# Altium footprint library ref-packages-longpad.PCBLIB: 1527 footprints (part 30 of 103)
Each footprint in its own frame and in the unit in brackets; x right, y up, seen from the top. Pads: shape width x height; smd on the part's side, far side on the other; paste and mask are expansions set on the pad; w line width, h text height; cw(c..) or ccw(c..) is an arc to the next point about the centre after c.
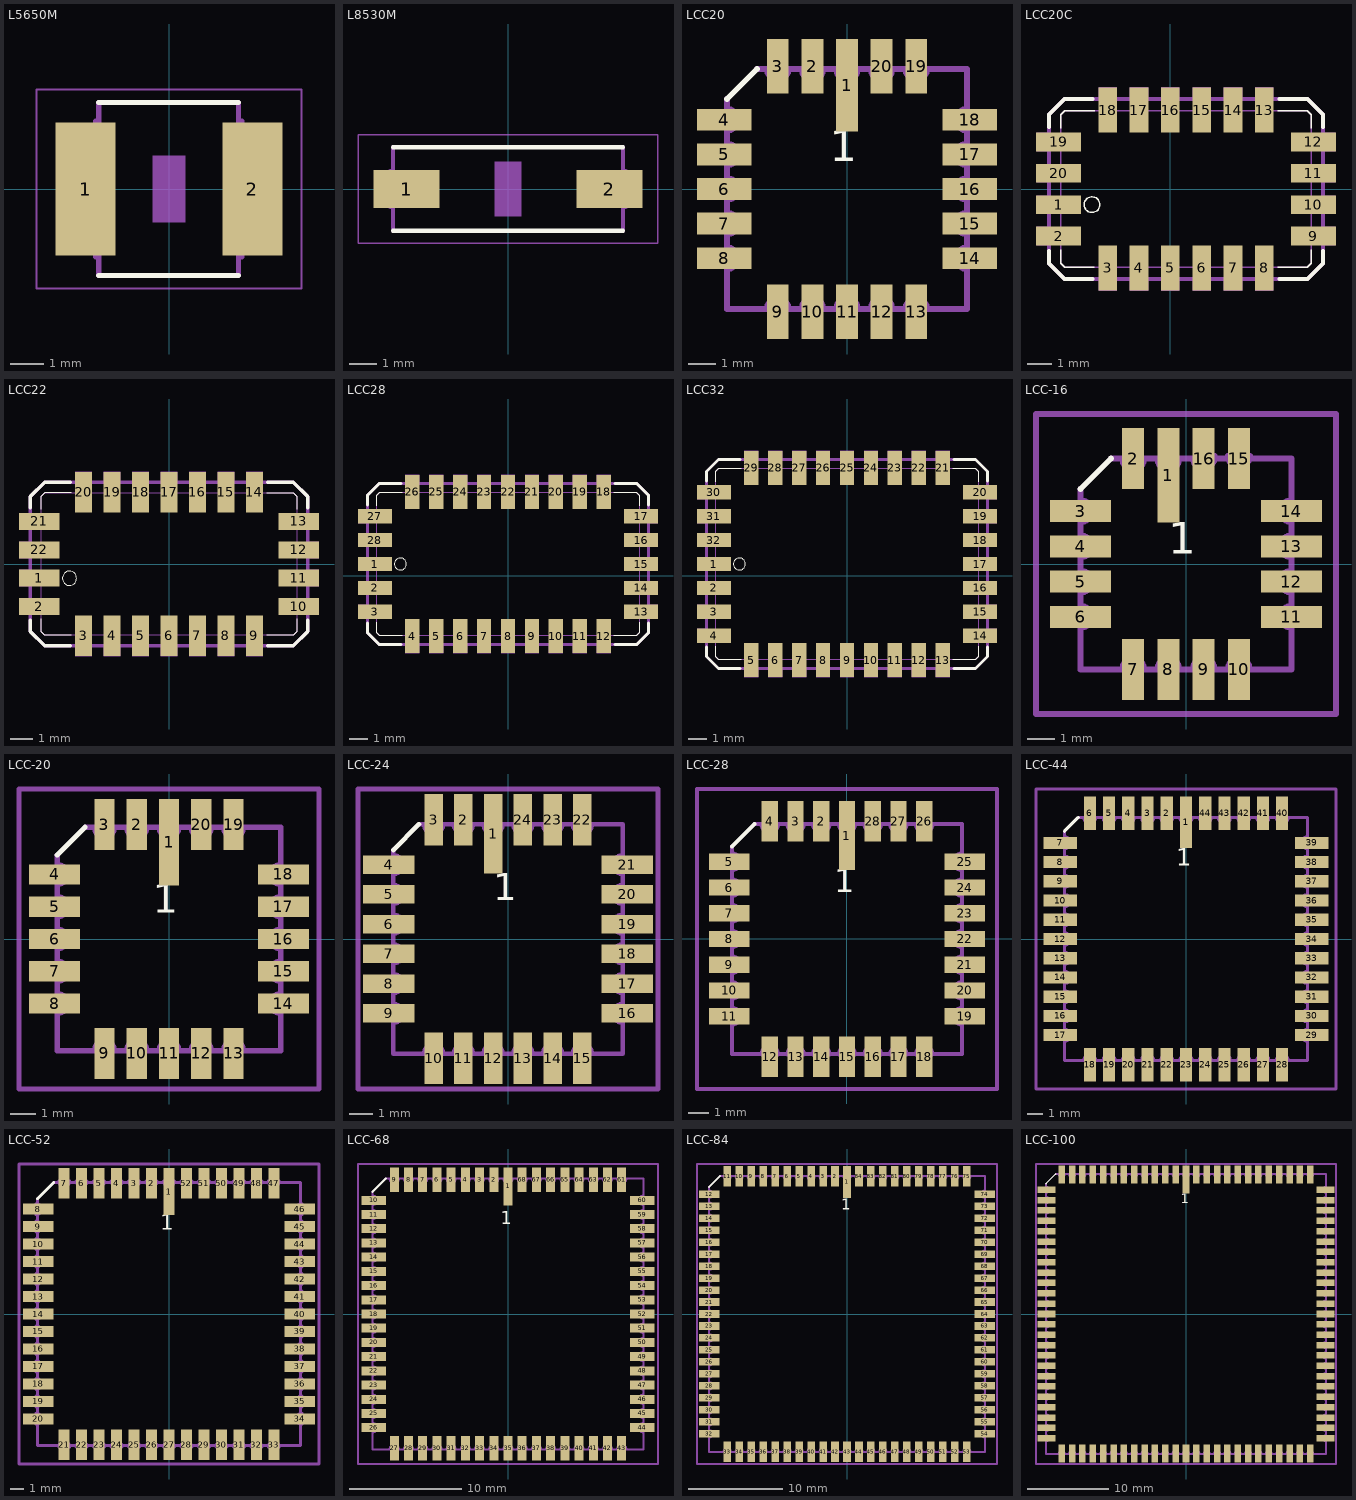
[diagram p29: the footprints below, top view; thin cyan lines are the x and y axes]

## L5650M [mm]
pads (2):
  rect 1.8x4 smd: 1(-2.5,0) 2(2.5,0)
Top Overlay:
  lines w0.152: -2.108,-2.591 2.083,-2.591 ; -2.108,2.591 2.083,2.591
Mechanical 6:
  rectangle: -0.5,-1 0.5,1
Mechanical 16:
  lines w0.152: -2.21,-2.032 -2.21,2.032 ; -2.108,-2.591 -2.108,2.591 ; 2.083,-2.591 2.083,2.591 ; 2.184,-2.032 2.184,2.032
Mechanical 27:
  lines w0.051: -3.973,-2.983 3.973,-2.983 3.973,2.983 -3.973,2.983 -3.973,-2.983

## L8530M [mm]
pads (2):
  rect 2.4x1.4 smd: 1(-3.7,0) 2(3.7,0)
Top Overlay:
  lines w0.152: -4.191,-1.524 4.191,-1.524 ; -4.191,1.524 4.191,1.524
Mechanical 6:
  rectangle: -0.5,-1 0.5,1
Mechanical 16:
  lines w0.152: -4.293,-0.66 -4.293,0.66 ; -4.191,-1.524 -4.191,1.524 ; 4.191,-1.524 4.191,1.524 ; 4.293,-0.66 4.293,0.66
Mechanical 27:
  lines w0.051: -5.473,-1.983 5.473,-1.983 5.473,1.983 -5.473,1.983 -5.473,-1.983

## LCC20 [mil]
pads (20):
  rect 31.5x133.86 smd: 1(0,149.61)
  rect 31.5x78.74 smd: 2(-50,177.17) 3(-100,177.17) 9(-100,-177.17) 10(-50,-177.17) 11(0,-177.17) 12(50,-177.17) 13(100,-177.17) 19(100,177.17) 20(50,177.17)
  rect 78.74x31.5 smd: 4(-177.17,100) 5(-177.17,50) 6(-177.17,0) 7(-177.17,-50) 8(-177.17,-100) 14(177.17,-100) 15(177.17,-50) 16(177.17,0) 17(177.17,50) 18(177.17,100)
Top Overlay:
  lines w8: -173.23,129.92 -129.92,173.23
  text "1" at -25,25 h77.5
Mechanical 16:
  lines w8: -173.23,-173.62 -173.23,-173.23 ; -173.23,-115.75 -173.23,-173.23 ; -173.23,-84.25 -173.23,-65.75 ; -173.23,-34.25 -173.23,-15.75 ; -173.23,15.75 -173.23,34.25 ; -173.23,65.75 -173.23,84.25 ; -173.23,115.75 -173.23,129.92 ; -173.17,-115.75 ccw(c-173.17,-100) -173.17,-84.25 ; -173.17,-65.75 ccw(c-173.17,-50) -173.17,-34.25 ; -173.17,-15.75 ccw(c-173.17,0) -173.17,15.75 ; -173.17,34.25 ccw(c-173.17,50) -173.17,65.75 ; -173.17,84.25 ccw(c-173.17,100) -173.17,115.75 ; -129.92,173.23 -115.75,173.23 ; -115.75,-173.23 -173.23,-173.23 ; -115.75,-173.17 cw(c-100,-173.17) -84.25,-173.17 ; -115.75,173.17 ccw(c-100,173.17) -84.25,173.17 ; -84.25,-173.23 -65.75,-173.23 ; -84.25,173.23 -65.75,173.23 ; -65.75,-173.17 cw(c-50,-173.17) -34.25,-173.17 ; -65.75,173.17 ccw(c-50,173.17) -34.25,173.17 ; -34.25,-173.23 -15.75,-173.23 ; -34.25,173.23 -15.75,173.23 ; -15.75,-173.17 cw(c0,-173.17) 15.75,-173.17 ; -15.75,173.17 ccw(c0,173.17) 15.75,173.17 ; 15.75,-173.23 34.25,-173.23 ; 15.75,173.23 34.25,173.23 ; 34.25,-173.17 cw(c50,-173.17) 65.75,-173.17 ; 34.25,173.17 ccw(c50,173.17) 65.75,173.17 ; 65.75,-173.23 84.25,-173.23 ; 65.75,173.23 84.25,173.23 ; 84.25,-173.17 cw(c100,-173.17) 115.75,-173.17 ; 84.25,173.17 ccw(c100,173.17) 115.75,173.17 ; 115.75,-173.23 173.23,-173.23 173.23,-115.75 ; 115.75,173.23 173.23,173.23 173.23,115.75 ; 173.17,-115.75 cw(c173.17,-100) 173.17,-84.25 ; 173.17,-65.75 cw(c173.17,-50) 173.17,-34.25 ; 173.17,-15.75 cw(c173.17,0) 173.17,15.75 ; 173.17,34.25 cw(c173.17,50) 173.17,65.75 ; 173.17,84.25 cw(c173.17,100) 173.17,115.75 ; 173.23,-84.25 173.23,-65.75 ; 173.23,-34.25 173.23,-15.75 ; 173.23,15.75 173.23,34.25 ; 173.23,65.75 173.23,84.25

## LCC20C [mil]
pads (20):
  rect 72.01x30 smd: 1(-178.35,-25) 2(-178.35,-75) 9(228.35,-75) 10(228.35,-25) 11(228.35,25) 12(228.35,75) 19(-178.35,75) 20(-178.35,25)
  rect 30x72.01 smd: 3(-100,-125.98) 4(-50,-125.98) 5(0,-125.98) 6(50,-125.98) 7(100,-125.98) 8(150,-125.98) 13(150,125.98) 14(100,125.98) 15(50,125.98) 16(0,125.98) 17(-50,125.98) 18(-100,125.98)
Top Overlay:
  circle w2: c-125,-25 r12.5
  lines w2: -175,-96.54 -175,-118.74 -168.74,-125 -121.69,-125 ; -175,96.54 -175,118.74 -168.74,125 -120.55,125 ; 171.54,-125 218.74,-125 225,-118.74 225,-96.54 ; 171.54,125 218.74,125 225,118.74 225,96.54
  lines w6: -193.74,-98.66 -193.74,-118.74 -168.74,-143.74 -123.66,-143.74 ; -193.75,98.67 -193.75,118.75 -168.75,143.75 -123.67,143.75 ; 173.67,-143.75 218.75,-143.75 243.75,-118.75 243.75,-98.67 ; 173.66,143.74 218.74,143.74 243.74,118.74 243.74,98.66
Mechanical 16:
  rectangle: -114.96,144.88 -85.04,162.6
  rectangle: -64.96,144.88 -35.04,162.6
  rectangle: -14.96,144.88 14.96,162.6
  rectangle: 35.04,144.88 64.96,162.6
  rectangle: 85.04,144.88 114.96,162.6
  rectangle: -114.96,-162.6 -85.04,-144.88
  rectangle: -64.96,-162.6 -35.04,-144.88
  rectangle: -14.96,-162.6 14.96,-144.88
  rectangle: 35.04,-162.6 64.96,-144.88
  rectangle: 85.04,-162.6 114.96,-144.88
  rectangle: 246.06,60.04 263.78,89.96
  rectangle: 246.06,10.04 263.78,39.96
  rectangle: 246.06,-39.96 263.78,-10.04
  rectangle: 246.06,-89.96 263.78,-60.04
  rectangle: -213.78,60.04 -196.06,89.96
  rectangle: -213.78,10.04 -196.06,39.96
  rectangle: -213.78,-39.96 -196.06,-10.04
  rectangle: -213.78,-89.96 -196.06,-60.04
  rectangle: 135.04,144.88 164.96,162.6
  rectangle: 135.04,-162.6 164.96,-144.88
  lines w2: -175,-118.74 -168.74,-125 218.74,-125 225,-118.74 225,118.74 218.74,125 -168.74,125 -175,118.74 -175,-118.74
  lines w6: 37.4,144.88 62.6,144.88 ; 87.4,144.88 112.6,144.88 ; 137.4,144.88 162.6,144.88 ; -193.74,-118.74 -168.74,-143.74 218.75,-143.75 243.75,-118.75 243.74,118.74 218.74,143.74 -168.75,143.75 -193.75,118.75 -193.74,-118.74

## LCC22 [mil]
pads (22):
  rect 70.87x29.92 smd: 1(-228.35,-25) 2(-228.35,-75) 10(228.35,-75) 11(228.35,-25) 12(228.35,25) 13(228.35,75) 21(-228.35,75) 22(-228.35,25)
  rect 29.92x70.87 smd: 3(-150,-125.98) 4(-100,-125.98) 5(-50,-125.98) 6(0,-125.98) 7(50,-125.98) 8(100,-125.98) 9(150,-125.98) 14(150,125.98) 15(100,125.98) 16(50,125.98) 17(0,125.98) 18(-50,125.98) 19(-100,125.98) 20(-150,125.98)
Top Overlay:
  circle w2: c-175,-25 r12.5
  lines w2: -225,-96.54 -225,-118.74 -218.74,-125 -171.54,-125 ; -225,96.54 -225,118.74 -218.74,125 -171.54,125 ; 171.54,-125 218.74,-125 225,-118.74 225,-96.54 ; 171.54,125 218.74,125 225,118.74 225,96.54
  lines w6: -243.74,-98.66 -243.74,-118.74 -218.74,-143.74 -173.66,-143.74 ; -243.75,98.67 -243.75,118.75 -218.75,143.75 -173.67,143.75 ; 173.67,-143.75 218.75,-143.75 243.75,-118.75 243.75,-98.67 ; 173.66,143.74 218.74,143.74 243.74,118.74 243.74,98.66
Mechanical 16:
  rectangle: -114.96,144.88 -85.04,162.6
  rectangle: -64.96,144.88 -35.04,162.6
  rectangle: -14.96,144.88 14.96,162.6
  rectangle: 35.04,144.88 64.96,162.6
  rectangle: 85.04,144.88 114.96,162.6
  rectangle: -114.96,-162.6 -85.04,-144.88
  rectangle: -64.96,-162.6 -35.04,-144.88
  rectangle: -14.96,-162.6 14.96,-144.88
  rectangle: 35.04,-162.6 64.96,-144.88
  rectangle: 85.04,-162.6 114.96,-144.88
  rectangle: 246.06,60.04 263.78,89.96
  rectangle: 246.06,10.04 263.78,39.96
  rectangle: 246.06,-39.96 263.78,-10.04
  rectangle: 246.06,-89.96 263.78,-60.04
  rectangle: -263.78,60.04 -246.06,89.96
  rectangle: -263.78,10.04 -246.06,39.96
  rectangle: -263.78,-39.96 -246.06,-10.04
  rectangle: -263.78,-89.96 -246.06,-60.04
  rectangle: 135.04,144.88 164.96,162.6
  rectangle: 135.04,-162.6 164.96,-144.88
  rectangle: -164.96,144.88 -135.04,162.6
  rectangle: -164.96,-162.6 -135.04,-144.88
  lines w2: -225,-118.74 -218.74,-125 218.74,-125 225,-118.74 225,118.74 218.74,125 -218.74,125 -225,118.74 -225,-118.74
  lines w6: 37.4,144.88 62.6,144.88 ; 87.4,144.88 112.6,144.88 ; 137.4,144.88 162.6,144.88 ; -243.74,-118.74 -218.74,-143.74 218.75,-143.75 243.75,-118.75 243.74,118.74 218.74,143.74 -218.75,143.75 -243.75,118.75 -243.74,-118.74

## LCC28 [mil]
pads (28):
  rect 70.87x29.92 smd: 1(-278.35,25) 2(-278.35,-25) 3(-278.35,-75) 13(278.35,-75) 14(278.35,-25) 15(278.35,25) 16(278.35,75) 17(278.35,125) 27(-278.35,125) 28(-278.35,75)
  rect 29.92x70.87 smd: 4(-200,-125.98) 5(-150,-125.98) 6(-100,-125.98) 7(-50,-125.98) 8(0,-125.98) 9(50,-125.98) 10(100,-125.98) 11(150,-125.98) 12(200,-125.98) 18(200,175.98) 19(150,175.98) 20(100,175.98) 21(50,175.98) 22(0,175.98) 23(-50,175.98) 24(-100,175.98) 25(-150,175.98) 26(-200,175.98)
Top Overlay:
  circle w2: c-225,25 r12.5
  lines w2: -275,-96.54 -275,-118.74 -268.74,-125 -221.69,-125 ; -275,146.54 -275,168.74 -268.74,175 -221.54,175 ; 221.54,-125 268.74,-125 275,-118.74 275,-96.54 ; 221.54,175 268.74,175 275,168.74 275,146.54
  lines w6: -293.74,-98.66 -293.74,-118.74 -268.74,-143.74 -223.66,-143.74 ; -293.75,148.67 -293.75,168.75 -268.75,193.75 -223.67,193.75 ; 223.67,-143.75 268.75,-143.75 293.75,-118.75 293.75,-98.67 ; 223.66,193.74 268.74,193.74 293.74,168.74 293.74,148.66
Mechanical 16:
  rectangle: -114.96,194.88 -85.04,212.6
  rectangle: -64.96,194.88 -35.04,212.6
  rectangle: -14.96,194.88 14.96,212.6
  rectangle: 35.04,194.88 64.96,212.6
  rectangle: 85.04,194.88 114.96,212.6
  rectangle: -114.96,-162.6 -85.04,-144.88
  rectangle: -64.96,-162.6 -35.04,-144.88
  rectangle: -14.96,-162.6 14.96,-144.88
  rectangle: 35.04,-162.6 64.96,-144.88
  rectangle: 85.04,-162.6 114.96,-144.88
  rectangle: 296.06,110.04 313.78,139.96
  rectangle: 296.06,10.04 313.78,39.96
  rectangle: 296.06,-39.96 313.78,-10.04
  rectangle: 296.06,-89.96 313.78,-60.04
  rectangle: -313.78,110.04 -296.06,139.96
  rectangle: -313.78,10.04 -296.06,39.96
  rectangle: -313.78,-39.96 -296.06,-10.04
  rectangle: -313.78,-89.96 -296.06,-60.04
  rectangle: 135.04,194.88 164.96,212.6
  rectangle: 135.04,-162.6 164.96,-144.88
  rectangle: -214.96,194.88 -185.04,212.6
  rectangle: -164.96,194.88 -135.04,212.6
  rectangle: -214.96,-162.6 -185.04,-144.88
  rectangle: -164.96,-162.6 -135.04,-144.88
  rectangle: 296.06,60.04 313.78,89.96
  rectangle: -313.78,60.04 -296.06,89.96
  rectangle: 185.04,194.88 214.96,212.6
  rectangle: 185.04,-162.6 214.96,-144.88
  lines w2: -275,-118.74 -268.74,-125 268.74,-125 275,-118.74 275,168.74 268.74,175 -268.74,175 -275,168.74 -275,-118.74
  lines w6: 37.4,194.88 62.6,194.88 ; 87.4,194.88 112.6,194.88 ; 137.4,194.88 162.6,194.88 ; 187.4,194.88 212.6,194.88 ; -293.74,-118.74 -268.74,-143.74 268.75,-143.75 293.75,-118.75 293.74,168.74 268.74,193.74 -268.75,193.75 -293.75,168.75 -293.74,-118.74

## LCC32 [mil]
pads (32):
  rect 70.87x29.92 smd: 1(-278.35,25) 2(-278.35,-25) 3(-278.35,-75) 4(-278.35,-125) 14(278.35,-125) 15(278.35,-75) 16(278.35,-25) 17(278.35,25) 18(278.35,75) 19(278.35,125) 20(278.35,175) 30(-278.35,175) 31(-278.35,125) 32(-278.35,75)
  rect 29.92x70.87 smd: 5(-200,-175.98) 6(-150,-175.98) 7(-100,-175.98) 8(-50,-175.98) 9(0,-175.98) 10(50,-175.98) 11(100,-175.98) 12(150,-175.98) 13(200,-175.98) 21(200,225.98) 22(150,225.98) 23(100,225.98) 24(50,225.98) 25(0,225.98) 26(-50,225.98) 27(-100,225.98) 28(-150,225.98) 29(-200,225.98)
Top Overlay:
  circle w2: c-225,25 r12.5
  lines w2: -275,-146.54 -275,-168.74 -268.74,-175 -221.69,-175 ; -275,196.54 -275,218.74 -268.74,225 -221.54,225 ; 221.54,-175 268.74,-175 275,-168.74 275,-146.54 ; 221.54,225 268.74,225 275,218.74 275,196.54
  lines w6: -293.74,-148.66 -293.74,-168.74 -268.74,-193.74 -223.66,-193.74 ; -293.75,198.67 -293.75,218.75 -268.75,243.75 -223.67,243.75 ; 223.67,-193.75 268.75,-193.75 293.75,-168.75 293.75,-148.67 ; 223.66,243.74 268.74,243.74 293.74,218.74 293.74,198.66
Mechanical 16:
  rectangle: -114.96,244.88 -85.04,262.6
  rectangle: -64.96,244.88 -35.04,262.6
  rectangle: -14.96,244.88 14.96,262.6
  rectangle: 35.04,244.88 64.96,262.6
  rectangle: 85.04,244.88 114.96,262.6
  rectangle: -114.96,-212.6 -85.04,-194.88
  rectangle: -64.96,-212.6 -35.04,-194.88
  rectangle: -14.96,-212.6 14.96,-194.88
  rectangle: 35.04,-212.6 64.96,-194.88
  rectangle: 85.04,-212.6 114.96,-194.88
  rectangle: 296.06,110.04 313.78,139.96
  rectangle: 296.06,10.04 313.78,39.96
  rectangle: 296.06,-39.96 313.78,-10.04
  rectangle: 296.06,-89.96 313.78,-60.04
  rectangle: -313.78,110.04 -296.06,139.96
  rectangle: -313.78,10.04 -296.06,39.96
  rectangle: -313.78,-39.96 -296.06,-10.04
  rectangle: -313.78,-89.96 -296.06,-60.04
  rectangle: 135.04,244.88 164.96,262.6
  rectangle: 135.04,-212.6 164.96,-194.88
  rectangle: -214.96,244.88 -185.04,262.6
  rectangle: -164.96,244.88 -135.04,262.6
  rectangle: -214.96,-212.6 -185.04,-194.88
  rectangle: -164.96,-212.6 -135.04,-194.88
  rectangle: 296.06,60.04 313.78,89.96
  rectangle: -313.78,60.04 -296.06,89.96
  rectangle: 185.04,244.88 214.96,262.6
  rectangle: 185.04,-212.6 214.96,-194.88
  rectangle: 296.06,160.04 313.78,189.96
  rectangle: -313.78,160.04 -296.06,189.96
  rectangle: 296.06,-139.96 313.78,-110.04
  rectangle: -313.78,-139.96 -296.06,-110.04
  lines w2: -275,-168.74 -268.74,-175 268.74,-175 275,-168.74 275,218.74 268.74,225 -268.74,225 -275,218.74 -275,-168.74
  lines w6: 37.4,244.88 62.6,244.88 ; 87.4,244.88 112.6,244.88 ; 137.4,244.88 162.6,244.88 ; 187.4,244.88 212.6,244.88 ; -293.74,-168.74 -268.74,-193.74 268.75,-193.75 293.75,-168.75 293.74,218.74 268.74,243.74 -268.75,243.75 -293.75,218.75 -293.74,-168.74

## LCC-16 [mil]
pads (16):
  rect 31.5x133.86 smd: 1(-25,125.98)
  rect 31.5x86.61 smd: 2(-75,149.61) 7(-75,-149.61) 8(-25,-149.61) 9(25,-149.61) 10(75,-149.61) 15(75,149.61) 16(25,149.61)
  rect 86.61x31.5 smd: 3(-149.61,75) 4(-149.61,25) 5(-149.61,-25) 6(-149.61,-75) 11(149.61,-75) 12(149.61,-25) 13(149.61,25) 14(149.61,75)
Top Overlay:
  lines w8: -149.61,106.3 -106.3,149.61
  text "1" at -25,0 h77.5
Mechanical 16:
  lines w8: -149.61,-150 -149.61,-149.61 ; -149.61,106.3 -149.61,90.75 cw(c-149.6,75) -149.6,59.25 -149.61,40.75 cw(c-149.6,25) -149.6,9.25 -149.61,-9.25 cw(c-149.6,-25) -149.6,-40.75 -149.61,-59.25 cw(c-149.6,-75) -149.6,-90.75 -149.61,-149.61 ; -106.3,149.61 -90.75,149.61 ccw(c-75,149.6) -59.25,149.6 -40.75,149.61 ccw(c-25,149.6) -9.25,149.6 9.25,149.61 ccw(c25,151.57) 40.75,153.54 ; 40.75,149.61 59.25,149.61 ; 59.25,153.54 ccw(c75,153.54) 90.75,153.54 ; 90.75,149.61 149.61,149.61 149.61,90.75 ccw(c149.6,75) 149.6,59.25 149.61,40.75 ccw(c149.6,25) 149.6,9.25 149.61,-9.25 ccw(c149.6,-25) 149.6,-40.75 149.61,-59.25 ccw(c149.6,-75) 149.6,-90.75 149.61,-149.61 90.75,-149.61 ccw(c75,-149.6) 59.25,-149.6 40.75,-149.61 ccw(c25,-149.6) 9.25,-149.6 -9.25,-149.61 ccw(c-25,-149.6) -40.75,-149.6 -59.25,-149.61 ccw(c-75,-149.6) -90.75,-149.6 -149.61,-149.61
Mechanical 27:
  lines w7.87: -212.72,-212.72 212.72,-212.72 212.72,212.72 -212.72,212.72 -212.72,-212.72

## LCC-20 [mil]
pads (20):
  rect 31.5x133.86 smd: 1(0,149.61)
  rect 31.5x78.74 smd: 2(-50,177.17) 3(-100,177.17) 9(-100,-177.17) 10(-50,-177.17) 11(0,-177.17) 12(50,-177.17) 13(100,-177.17) 19(100,177.17) 20(50,177.17)
  rect 78.74x31.5 smd: 4(-177.17,100) 5(-177.17,50) 6(-177.17,0) 7(-177.17,-50) 8(-177.17,-100) 14(177.17,-100) 15(177.17,-50) 16(177.17,0) 17(177.17,50) 18(177.17,100)
Top Overlay:
  lines w8: -173.23,129.92 -129.92,173.23
  text "1" at -25,25 h77.5
Mechanical 16:
  lines w8: -173.23,-173.62 -173.23,-173.23 ; -173.23,129.92 -173.23,115.75 cw(c-173.23,100) -173.23,84.25 -173.23,65.75 cw(c-173.23,50) -173.23,34.25 -173.23,15.75 cw(c-173.23,0) -173.23,-15.75 -173.23,-34.25 cw(c-173.23,-50) -173.23,-65.75 -173.23,-84.25 cw(c-173.23,-100) -173.23,-115.75 -173.23,-173.23 ; -129.92,173.23 -115.75,173.23 ccw(c-100,173.23) -84.25,173.23 -65.75,173.23 ccw(c-50,173.23) -34.25,173.23 -15.75,173.23 ccw(c0,173.23) 15.75,173.23 34.25,173.23 ccw(c50,173.23) 65.75,173.23 84.25,173.23 ccw(c100,173.23) 115.75,173.23 173.23,173.23 173.23,115.75 ccw(c173.23,100) 173.23,84.25 173.23,65.75 ccw(c173.23,50) 173.23,34.25 173.23,15.75 ccw(c173.23,0) 173.23,-15.75 173.23,-34.25 ccw(c173.23,-50) 173.23,-65.75 173.23,-84.25 ccw(c173.23,-100) 173.23,-115.75 173.23,-173.23 115.75,-173.23 ccw(c100,-173.23) 84.25,-173.23 65.75,-173.23 ccw(c50,-173.23) 34.25,-173.23 15.75,-173.23 ccw(c0,-173.23) -15.75,-173.23 -34.25,-173.23 ccw(c-50,-173.23) -65.75,-173.23 -84.25,-173.23 ccw(c-100,-173.23) -115.75,-173.23 -173.23,-173.23
Mechanical 27:
  lines w7.87: -232.4,-232.4 232.4,-232.4 232.4,232.4 -232.4,232.4 -232.4,-232.4

## LCC-24 [mil]
pads (24):
  rect 31.5x133.86 smd: 1(-25,177.17)
  rect 31.5x86.61 smd: 2(-75,200.79) 3(-125,200.79) 10(-125,-200.79) 11(-75,-200.79) 12(-25,-200.79) 13(25,-200.79) 14(75,-200.79) 15(125,-200.79) 22(125,200.79) 23(75,200.79) 24(25,200.79)
  rect 86.61x31.5 smd: 4(-200.79,125) 5(-200.79,75) 6(-200.79,25) 7(-200.79,-25) 8(-200.79,-75) 9(-200.79,-125) 16(200.79,-125) 17(200.79,-75) 18(200.79,-25) 19(200.79,25) 20(200.79,75) 21(200.79,125)
Top Overlay:
  lines w8: -192.91,149.41 -149.61,192.72
  text "1" at -25,50 h77.5
Mechanical 16:
  lines w8: -192.91,149.41 -192.91,140.75 cw(c-192.91,125) -192.91,109.25 -192.91,90.75 cw(c-192.91,75) -192.91,59.25 -192.91,40.75 cw(c-192.91,25) -192.91,9.25 -192.91,-9.25 cw(c-192.91,-25) -192.91,-40.75 -192.91,-59.25 cw(c-192.91,-75) -192.91,-90.75 -192.91,-109.25 cw(c-192.91,-125) -192.91,-140.75 -192.91,-192.91 -140.75,-192.91 cw(c-125,-192.91) -109.25,-192.91 -90.75,-192.91 cw(c-75,-192.91) -59.25,-192.91 -40.75,-192.91 cw(c-25,-192.91) -9.25,-192.91 9.25,-192.91 cw(c25,-192.91) 40.75,-192.91 59.25,-192.91 cw(c75,-192.91) 90.75,-192.91 109.25,-192.91 cw(c125,-192.91) 140.75,-192.91 192.91,-192.91 192.91,-140.75 cw(c192.91,-125) 192.91,-109.25 192.91,-90.75 cw(c192.91,-75) 192.91,-59.25 192.91,-40.75 cw(c192.91,-25) 192.91,-9.25 192.91,9.25 cw(c192.91,25) 192.91,40.75 192.91,59.25 cw(c192.91,75) 192.91,90.75 192.91,109.25 cw(c192.91,125) 192.91,140.75 192.91,192.72 140.75,192.72 cw(c125,192.71) 109.25,192.71 90.75,192.72 cw(c75,192.71) 59.25,192.71 40.75,192.72 cw(c25,192.71) 9.25,192.71 -9.25,192.72 cw(c-25,192.71) -40.75,192.71 -59.25,192.72 cw(c-75,192.71) -90.75,192.71 -109.25,192.72 cw(c-125,192.71) -140.75,192.71 -149.61,192.72
Mechanical 27:
  lines w7.87: -252.09,-252.09 252.09,-252.09 252.09,252.09 -252.09,252.09 -252.09,-252.09

## LCC-28 [mil]
pads (28):
  rect 31.5x133.86 smd: 1(0,200.79)
  rect 31.5x78.74 smd: 2(-50,228.35) 3(-100,228.35) 4(-150,228.35) 12(-150,-228.35) 13(-100,-228.35) 14(-50,-228.35) 15(0,-228.35) 16(50,-228.35) 17(100,-228.35) 18(150,-228.35) 26(150,228.35) 27(100,228.35) 28(50,228.35)
  rect 78.74x31.5 smd: 5(-228.35,150) 6(-228.35,100) 7(-228.35,50) 8(-228.35,0) 9(-228.35,-50) 10(-228.35,-100) 11(-228.35,-150) 19(228.35,-150) 20(228.35,-100) 21(228.35,-50) 22(228.35,0) 23(228.35,50) 24(228.35,100) 25(228.35,150)
Top Overlay:
  lines w8: -223.23,179.92 -179.92,223.23
  text "1" at -25,75 h77.5
Mechanical 16:
  lines w8: -223.23,179.92 -223.23,165.75 cw(c-223.23,150) -223.23,134.25 -223.23,115.75 cw(c-223.23,100) -223.23,84.25 -223.23,65.75 cw(c-223.23,50) -223.23,34.25 -223.23,15.75 cw(c-223.23,0) -223.23,-15.75 -223.23,-34.25 cw(c-223.23,-50) -223.23,-65.75 -223.23,-84.25 cw(c-223.23,-100) -223.23,-115.75 -223.23,-134.25 cw(c-223.23,-150) -223.23,-165.75 -223.23,-223.23 -165.75,-223.23 ; -179.92,223.23 -165.75,223.23 ccw(c-150,223.23) -134.25,223.23 -115.75,223.23 ccw(c-100,223.23) -84.25,223.23 -65.75,223.23 ccw(c-50,223.23) -34.25,223.23 -15.75,223.23 ccw(c0,223.23) 15.75,223.23 34.25,223.23 ccw(c50,223.23) 65.75,223.23 84.25,223.23 ccw(c100,223.23) 115.75,223.23 134.25,223.23 ccw(c150,223.23) 165.75,223.23 223.23,223.23 223.23,165.75 ccw(c223.23,150) 223.23,134.25 223.23,115.75 ccw(c223.23,100) 223.23,84.25 223.23,65.75 ccw(c223.23,50) 223.23,34.25 223.23,15.75 ccw(c223.23,0) 223.23,-15.75 223.23,-34.25 ccw(c223.23,-50) 223.23,-65.75 223.23,-84.25 ccw(c223.23,-100) 223.23,-115.75 223.23,-134.25 ccw(c223.23,-150) 223.23,-165.75 223.23,-223.23 165.75,-223.23 ; -165.75,-224.22 cw(c-150,-224.22) -134.25,-224.22 ; -134.25,-223.23 -115.75,-223.23 ; -115.75,-224.22 cw(c-100,-224.22) -84.25,-224.22 ; -84.25,-223.23 -65.75,-223.23 ; -65.75,-224.22 cw(c-50,-224.22) -34.25,-224.22 ; -34.25,-223.23 -15.75,-223.23 ; -15.75,-224.22 cw(c0,-224.22) 15.75,-224.22 ; 15.75,-223.23 34.25,-223.23 ; 34.25,-224.22 cw(c50,-224.22) 65.75,-224.22 ; 65.75,-223.23 84.25,-223.23 ; 84.25,-224.22 cw(c100,-224.22) 115.75,-224.22 ; 115.75,-223.23 134.25,-223.23 ; 134.25,-224.22 cw(c150,-224.22) 165.75,-224.22
Mechanical 27:
  lines w7.87: -291.46,-291.46 291.46,-291.46 291.46,291.46 -291.46,291.46 -291.46,-291.46

## LCC-44 [mil]
pads (44):
  rect 31.5x133.86 smd: 1(0,303.15)
  rect 31.5x86.61 smd: 2(-50,326.77) 3(-100,326.77) 4(-150,326.77) 5(-200,326.77) 6(-250,326.77) 18(-250,-326.77) 19(-200,-326.77) 20(-150,-326.77) 21(-100,-326.77) 22(-50,-326.77) 23(0,-326.77) 24(50,-326.77) 25(100,-326.77) 26(150,-326.77) 27(200,-326.77) 28(250,-326.77) 40(250,326.77) 41(200,326.77) 42(150,326.77) 43(100,326.77) 44(50,326.77)
  rect 86.61x31.5 smd: 7(-326.77,250) 8(-326.77,200) 9(-326.77,150) 10(-326.77,100) 11(-326.77,50) 12(-326.77,0) 13(-326.77,-50) 14(-326.77,-100) 15(-326.77,-150) 16(-326.77,-200) 17(-326.77,-250) 29(326.77,-250) 30(326.77,-200) 31(326.77,-150) 32(326.77,-100) 33(326.77,-50) 34(326.77,0) 35(326.77,50) 36(326.77,100) 37(326.77,150) 38(326.77,200) 39(326.77,250)
Top Overlay:
  lines w8: -316.14,279.92 -279.92,316.14
  text "1" at -25,175 h77.5
Mechanical 16:
  lines w8: -316.14,279.92 -316.14,265.75 cw(c-316.14,250) -316.14,234.25 -316.14,215.75 cw(c-316.14,200) -316.14,184.25 -316.14,165.75 cw(c-316.14,150) -316.14,134.25 -316.14,115.75 cw(c-316.14,100) -316.14,84.25 -316.14,65.75 cw(c-316.14,50) -316.14,34.25 -316.14,15.75 cw(c-316.14,0) -316.14,-15.75 -316.14,-34.25 cw(c-316.14,-50) -316.14,-65.75 -316.14,-84.25 cw(c-316.14,-100) -316.14,-115.75 -316.14,-134.25 cw(c-316.14,-150) -316.14,-165.75 -316.14,-184.25 cw(c-316.14,-200) -316.14,-215.75 -316.14,-234.25 cw(c-316.14,-250) -316.14,-265.75 -316.14,-316.14 -265.75,-316.14 cw(c-250,-316.14) -234.25,-316.14 -215.75,-316.14 cw(c-200,-316.14) -184.25,-316.14 -165.75,-316.14 cw(c-150,-316.14) -134.25,-316.14 -115.75,-316.14 cw(c-100,-316.14) -84.25,-316.14 -65.75,-316.14 cw(c-50,-316.14) -34.25,-316.14 -15.75,-316.14 cw(c0,-316.14) 15.75,-316.14 34.25,-316.14 cw(c50,-316.14) 65.75,-316.14 84.25,-316.14 cw(c100,-316.14) 115.75,-316.14 134.25,-316.14 cw(c150,-316.14) 165.75,-316.14 184.25,-316.14 cw(c200,-316.14) 215.75,-316.14 234.25,-316.14 cw(c250,-316.14) 265.75,-316.14 316.14,-316.14 316.14,-265.75 cw(c316.14,-250) 316.14,-234.25 316.14,-215.75 cw(c316.14,-200) 316.14,-184.25 316.14,-165.75 cw(c316.14,-150) 316.14,-134.25 316.14,-115.75 cw(c316.14,-100) 316.14,-84.25 316.14,-65.75 cw(c316.14,-50) 316.14,-34.25 316.14,-15.75 cw(c316.14,0) 316.14,15.75 316.14,34.25 cw(c316.14,50) 316.14,65.75 316.14,84.25 cw(c316.14,100) 316.14,115.75 316.14,134.25 cw(c316.14,150) 316.14,165.75 316.14,184.25 cw(c316.14,200) 316.14,215.75 316.14,234.25 cw(c316.14,250) 316.14,265.75 316.14,316.14 265.75,316.14 cw(c250,316.14) 234.25,316.14 215.75,316.14 cw(c200,316.14) 184.25,316.14 165.75,316.14 cw(c150,316.14) 134.25,316.14 115.75,316.14 cw(c100,316.14) 84.25,316.14 65.75,316.14 cw(c50,316.14) 34.25,316.14 15.75,316.14 cw(c0,316.14) -15.75,316.14 -34.25,316.14 cw(c-50,316.14) -65.75,316.14 -84.25,316.14 cw(c-100,316.14) -115.75,316.14 -134.25,316.14 cw(c-150,316.14) -165.75,316.14 -184.25,316.14 cw(c-200,316.14) -215.75,316.14 -234.25,316.14 cw(c-250,316.14) -265.75,316.14 -279.92,316.14
Mechanical 27:
  lines w7.87: -389.88,-389.88 389.88,-389.88 389.88,389.88 -389.88,389.88 -389.88,-389.88

## LCC-52 [mil]
pads (52):
  rect 31.5x133.86 smd: 1(0,350.39)
  rect 31.5x86.61 smd: 2(-50,374.02) 3(-100,374.02) 4(-150,374.02) 5(-200,374.02) 6(-250,374.02) 7(-300,374.02) 21(-300,-374.02) 22(-250,-374.02) 23(-200,-374.02) 24(-150,-374.02) 25(-100,-374.02) 26(-50,-374.02) 27(0,-374.02) 28(50,-374.02) 29(100,-374.02) 30(150,-374.02) 31(200,-374.02) 32(250,-374.02) 33(300,-374.02) 47(300,374.02) 48(250,374.02) 49(200,374.02) 50(150,374.02) 51(100,374.02) 52(50,374.02)
  rect 86.61x31.5 smd: 8(-374.02,300) 9(-374.02,250) 10(-374.02,200) 11(-374.02,150) 12(-374.02,100) 13(-374.02,50) 14(-374.02,0) 15(-374.02,-50) 16(-374.02,-100) 17(-374.02,-150) 18(-374.02,-200) 19(-374.02,-250) 20(-374.02,-300) 34(374.02,-300) 35(374.02,-250) 36(374.02,-200) 37(374.02,-150) 38(374.02,-100) 39(374.02,-50) 40(374.02,0) 41(374.02,50) 42(374.02,100) 43(374.02,150) 44(374.02,200) 45(374.02,250) 46(374.02,300)
Top Overlay:
  lines w8: -376.38,329.92 -329.92,376.38
  text "1" at -25,225 h77.5
Mechanical 16:
  lines w8: -380.31,-315.75 ccw(c-380.31,-300) -380.31,-284.25 ; -380.31,-265.75 ccw(c-380.31,-250) -380.31,-234.25 ; -380.31,-215.75 ccw(c-380.31,-200) -380.31,-184.25 ; -380.31,-165.75 ccw(c-380.31,-150) -380.31,-134.25 ; -380.31,-115.75 ccw(c-380.31,-100) -380.31,-84.25 ; -380.31,-65.75 ccw(c-380.31,-50) -380.31,-34.25 ; -380.31,-15.75 ccw(c-380.31,0) -380.31,15.75 ; -380.31,34.25 ccw(c-380.31,50) -380.31,65.75 ; -380.31,84.25 ccw(c-380.31,100) -380.31,115.75 ; -380.31,134.25 ccw(c-380.31,150) -380.31,165.75 ; -380.31,184.25 ccw(c-380.31,200) -380.31,215.75 ; -380.31,234.25 ccw(c-380.31,250) -380.31,265.75 ; -380.31,284.25 ccw(c-380.31,300) -380.31,315.75 ; -376.38,-315.75 -376.38,-376.38 -315.75,-376.38 ; -376.38,-284.25 -376.38,-265.75 ; -376.38,-234.25 -376.38,-215.75 ; -376.38,-184.25 -376.38,-165.75 ; -376.38,-134.25 -376.38,-115.75 ; -376.38,-84.25 -376.38,-65.75 ; -376.38,-34.25 -376.38,-15.75 ; -376.38,15.75 -376.38,34.25 ; -376.38,65.75 -376.38,84.25 ; -376.38,115.75 -376.38,134.25 ; -376.38,165.75 -376.38,184.25 ; -376.38,215.75 -376.38,234.25 ; -376.38,265.75 -376.38,284.25 ; -376.38,315.75 -376.38,329.92 ; -329.92,376.38 -315.75,376.38 ; -315.75,-380.31 cw(c-300,-380.31) -284.25,-380.31 ; -315.75,380.31 ccw(c-300,380.31) -284.25,380.31 ; -284.25,-376.38 -265.75,-376.38 ; -284.25,376.38 -265.75,376.38 ; -265.75,-380.31 cw(c-250,-380.31) -234.25,-380.31 ; -265.75,380.31 ccw(c-250,380.31) -234.25,380.31 ; -234.25,-376.38 -215.75,-376.38 ; -234.25,376.38 -215.75,376.38 ; -215.75,-380.31 cw(c-200,-380.31) -184.25,-380.31 ; -215.75,380.31 ccw(c-200,380.31) -184.25,380.31 ; -184.25,-376.38 -165.75,-376.38 ; -184.25,376.38 -165.75,376.38 ; -165.75,-380.31 cw(c-150,-380.31) -134.25,-380.31 ; -165.75,380.31 ccw(c-150,380.31) -134.25,380.31 ; -134.25,-376.38 -115.75,-376.38 ; -134.25,376.38 -115.75,376.38 ; -115.75,-380.31 cw(c-100,-380.31) -84.25,-380.31 ; -115.75,380.31 ccw(c-100,380.31) -84.25,380.31 ; -84.25,-376.38 -65.75,-376.38 ; -84.25,376.38 -65.75,376.38 ; -65.75,-380.31 cw(c-50,-380.31) -34.25,-380.31 ; -65.75,380.31 ccw(c-50,380.31) -34.25,380.31 ; -34.25,-376.38 -15.75,-376.38 ; -34.25,376.38 -15.75,376.38 ; -15.75,-380.31 cw(c0,-380.31) 15.75,-380.31 ; -15.75,380.31 ccw(c0,380.31) 15.75,380.31 ; 15.75,-376.38 34.25,-376.38 ; 15.75,376.38 34.25,376.38 ; 34.25,-380.31 cw(c50,-380.31) 65.75,-380.31 ; 34.25,380.31 ccw(c50,380.31) 65.75,380.31 ; 65.75,-376.38 84.25,-376.38 ; 65.75,376.38 84.25,376.38 ; 84.25,-380.31 cw(c100,-380.31) 115.75,-380.31 ; 84.25,380.31 ccw(c100,380.31) 115.75,380.31 ; 115.75,-376.38 134.25,-376.38 ; 115.75,376.38 134.25,376.38 ; 134.25,-380.31 cw(c150,-380.31) 165.75,-380.31 ; 134.25,380.31 ccw(c150,380.31) 165.75,380.31 ; 165.75,-376.38 184.25,-376.38 ; 165.75,376.38 184.25,376.38 ; 184.25,-380.31 cw(c200,-380.31) 215.75,-380.31 ; 184.25,380.31 ccw(c200,380.31) 215.75,380.31 ; 215.75,-376.38 234.25,-376.38 ; 215.75,376.38 234.25,376.38 ; 234.25,-380.31 cw(c250,-380.31) 265.75,-380.31 ; 234.25,380.31 ccw(c250,380.31) 265.75,380.31 ; 265.75,-376.38 284.25,-376.38 ; 265.75,376.38 284.25,376.38 ; 284.25,-380.31 cw(c300,-380.31) 315.75,-380.31 ; 284.25,380.31 ccw(c300,380.31) 315.75,380.31 ; 315.75,-376.38 376.38,-376.38 376.38,-315.75 ; 315.75,376.38 376.38,376.38 376.38,315.75 ; 376.38,-284.25 376.38,-265.75 ; 376.38,-234.25 376.38,-215.75 ; 376.38,-184.25 376.38,-165.75 ; 376.38,-134.25 376.38,-115.75 ; 376.38,-84.25 376.38,-65.75 ; 376.38,-34.25 376.38,-15.75 ; 376.38,15.75 376.38,34.25 ; 376.38,65.75 376.38,84.25 ; 376.38,115.75 376.38,134.25 ; 376.38,165.75 376.38,184.25 ; 376.38,215.75 376.38,234.25 ; 376.38,265.75 376.38,284.25 ; 380.31,-315.75 cw(c380.31,-300) 380.31,-284.25 ; 380.31,-265.75 cw(c380.31,-250) 380.31,-234.25 ; 380.31,-215.75 cw(c380.31,-200) 380.31,-184.25 ; 380.31,-165.75 cw(c380.31,-150) 380.31,-134.25 ; 380.31,-115.75 cw(c380.31,-100) 380.31,-84.25 ; 380.31,-65.75 cw(c380.31,-50) 380.31,-34.25 ; 380.31,-15.75 cw(c380.31,0) 380.31,15.75 ; 380.31,34.25 cw(c380.31,50) 380.31,65.75 ; 380.31,84.25 cw(c380.31,100) 380.31,115.75 ; 380.31,134.25 cw(c380.31,150) 380.31,165.75 ; 380.31,184.25 cw(c380.31,200) 380.31,215.75 ; 380.31,234.25 cw(c380.31,250) 380.31,265.75 ; 380.31,284.25 cw(c380.31,300) 380.31,315.75
Mechanical 27:
  lines w7.87: -429.25,-429.25 429.25,-429.25 429.25,429.25 -429.25,429.25 -429.25,-429.25

## LCC-68 [mil]
pads (68):
  rect 31.5x133.86 smd: 1(0,448.82)
  rect 31.5x86.61 smd: 2(-50,472.44) 3(-100,472.44) 4(-150,472.44) 5(-200,472.44) 6(-250,472.44) 7(-300,472.44) 8(-350,472.44) 9(-400,472.44) 27(-400,-472.44) 28(-350,-472.44) 29(-300,-472.44) 30(-250,-472.44) 31(-200,-472.44) 32(-150,-472.44) 33(-100,-472.44) 34(-50,-472.44) 35(0,-472.44) 36(50,-472.44) 37(100,-472.44) 38(150,-472.44) 39(200,-472.44) 40(250,-472.44) 41(300,-472.44) 42(350,-472.44) 43(400,-472.44) 61(400,472.44) 62(350,472.44) 63(300,472.44) 64(250,472.44) 65(200,472.44) 66(150,472.44) 67(100,472.44) 68(50,472.44)
  rect 86.61x31.5 smd: 10(-472.44,400) 11(-472.44,350) 12(-472.44,300) 13(-472.44,250) 14(-472.44,200) 15(-472.44,150) 16(-472.44,100) 17(-472.44,50) 18(-472.44,0) 19(-472.44,-50) 20(-472.44,-100) 21(-472.44,-150) 22(-472.44,-200) 23(-472.44,-250) 24(-472.44,-300) 25(-472.44,-350) 26(-472.44,-400) 44(472.44,-400) 45(472.44,-350) 46(472.44,-300) 47(472.44,-250) 48(472.44,-200) 49(472.44,-150) 50(472.44,-100) 51(472.44,-50) 52(472.44,0) 53(472.44,50) 54(472.44,100) 55(472.44,150) 56(472.44,200) 57(472.44,250) 58(472.44,300) 59(472.44,350) 60(472.44,400)
Top Overlay:
  lines w8: -476.38,429.92 -429.92,476.38
  text "1" at -25,300 h77.5
Mechanical 16:
  lines w8: -476.38,-415.75 -476.38,-476.38 -415.75,-476.38 ; -476.38,-384.25 -476.38,-365.75 ; -476.38,-334.25 -476.38,-315.75 ; -476.38,-284.25 -476.38,-265.75 ; -476.38,-234.25 -476.38,-215.75 ; -476.38,-184.25 -476.38,-165.75 ; -476.38,-134.25 -476.38,-115.75 ; -476.38,-84.25 -476.38,-65.75 ; -476.38,-34.25 -476.38,-15.75 ; -476.38,15.75 -476.38,34.25 ; -476.38,65.75 -476.38,84.25 ; -476.38,115.75 -476.38,134.25 ; -476.38,165.75 -476.38,184.25 ; -476.38,215.75 -476.38,234.25 ; -476.38,265.75 -476.38,284.25 ; -476.38,315.75 -476.38,334.25 ; -476.38,365.75 -476.38,384.25 ; -476.38,415.75 -476.38,429.92 ; -476.31,-415.75 ccw(c-476.31,-400) -476.31,-384.25 ; -476.31,-365.75 ccw(c-476.31,-350) -476.31,-334.25 ; -476.31,-315.75 ccw(c-476.31,-300) -476.31,-284.25 ; -476.31,-265.75 ccw(c-476.31,-250) -476.31,-234.25 ; -476.31,-215.75 ccw(c-476.31,-200) -476.31,-184.25 ; -476.31,-165.75 ccw(c-476.31,-150) -476.31,-134.25 ; -476.31,-115.75 ccw(c-476.31,-100) -476.31,-84.25 ; -476.31,-65.75 ccw(c-476.31,-50) -476.31,-34.25 ; -476.31,-15.75 ccw(c-476.31,0) -476.31,15.75 ; -476.31,34.25 ccw(c-476.31,50) -476.31,65.75 ; -476.31,84.25 ccw(c-476.31,100) -476.31,115.75 ; -476.31,134.25 ccw(c-476.31,150) -476.31,165.75 ; -476.31,184.25 ccw(c-476.31,200) -476.31,215.75 ; -476.31,234.25 ccw(c-476.31,250) -476.31,265.75 ; -476.31,284.25 ccw(c-476.31,300) -476.31,315.75 ; -476.31,334.25 ccw(c-476.31,350) -476.31,365.75 ; -476.31,384.25 ccw(c-476.31,400) -476.31,415.75 ; -429.92,476.38 -415.75,476.38 ; -415.75,-476.31 cw(c-400,-476.31) -384.25,-476.31 ; -415.75,476.31 ccw(c-400,476.31) -384.25,476.31 ; -384.25,-476.38 -365.75,-476.38 ; -384.25,476.38 -365.75,476.38 ; -365.75,-476.31 cw(c-350,-476.31) -334.25,-476.31 ; -365.75,476.31 ccw(c-350,476.31) -334.25,476.31 ; -334.25,-476.38 -315.75,-476.38 ; -334.25,476.38 -315.75,476.38 ; -315.75,-476.31 cw(c-300,-476.31) -284.25,-476.31 ; -315.75,476.31 ccw(c-300,476.31) -284.25,476.31 ; -284.25,-476.38 -265.75,-476.38 ; -284.25,476.38 -265.75,476.38 ; -265.75,-476.31 cw(c-250,-476.31) -234.25,-476.31 ; -265.75,476.31 ccw(c-250,476.31) -234.25,476.31 ; -234.25,-476.38 -215.75,-476.38 ; -234.25,476.38 -215.75,476.38 ; -215.75,-476.31 cw(c-200,-476.31) -184.25,-476.31 ; -215.75,476.31 ccw(c-200,476.31) -184.25,476.31 ; -184.25,-476.38 -165.75,-476.38 ; -184.25,476.38 -165.75,476.38 ; -165.75,-476.31 cw(c-150,-476.31) -134.25,-476.31 ; -165.75,476.31 ccw(c-150,476.31) -134.25,476.31 ; -134.25,-476.38 -115.75,-476.38 ; -134.25,476.38 -115.75,476.38 ; -115.75,-476.31 cw(c-100,-476.31) -84.25,-476.31 ; -115.75,476.31 ccw(c-100,476.31) -84.25,476.31 ; -84.25,-476.38 -65.75,-476.38 ; -84.25,476.38 -65.75,476.38 ; -65.75,-476.31 cw(c-50,-476.31) -34.25,-476.31 ; -65.75,476.31 ccw(c-50,476.31) -34.25,476.31 ; -34.25,-476.38 -15.75,-476.38 ; -34.25,476.38 -15.75,476.38 ; -15.75,-476.31 cw(c0,-476.31) 15.75,-476.31 ; -15.75,476.31 ccw(c0,476.31) 15.75,476.31 ; 15.75,-476.38 34.25,-476.38 ; 15.75,476.38 34.25,476.38 ; 34.25,-476.31 cw(c50,-476.31) 65.75,-476.31 ; 34.25,476.31 ccw(c50,476.31) 65.75,476.31 ; 65.75,-476.38 84.25,-476.38 ; 65.75,476.38 84.25,476.38 ; 84.25,-476.31 cw(c100,-476.31) 115.75,-476.31 ; 84.25,476.31 ccw(c100,476.31) 115.75,476.31 ; 115.75,-476.38 134.25,-476.38 ; 115.75,476.38 134.25,476.38 ; 134.25,-476.31 cw(c150,-476.31) 165.75,-476.31 ; 134.25,476.31 ccw(c150,476.31) 165.75,476.31 ; 165.75,-476.38 184.25,-476.38 ; 165.75,476.38 184.25,476.38 ; 184.25,-476.31 cw(c200,-476.31) 215.75,-476.31 ; 184.25,476.31 ccw(c200,476.31) 215.75,476.31 ; 215.75,-476.38 234.25,-476.38 ; 215.75,476.38 234.25,476.38 ; 234.25,-476.31 cw(c250,-476.31) 265.75,-476.31 ; 234.25,476.31 ccw(c250,476.31) 265.75,476.31 ; 265.75,-476.38 284.25,-476.38 ; 265.75,476.38 284.25,476.38 ; 284.25,-476.31 cw(c300,-476.31) 315.75,-476.31 ; 284.25,476.31 ccw(c300,476.31) 315.75,476.31 ; 315.75,-476.38 334.25,-476.38 ; 315.75,476.38 334.25,476.38 ; 334.25,-476.31 cw(c350,-476.31) 365.75,-476.31 ; 334.25,476.31 ccw(c350,476.31) 365.75,476.31 ; 365.75,-476.38 384.25,-476.38 ; 365.75,476.38 384.25,476.38 ; 384.25,-476.31 cw(c400,-476.31) 415.75,-476.31 ; 384.25,476.31 ccw(c400,476.31) 415.75,476.31 ; 415.75,-476.38 476.38,-476.38 476.38,-415.75 ; 415.75,476.38 476.38,476.38 476.38,415.75 ; 476.31,-415.75 cw(c476.31,-400) 476.31,-384.25 ; 476.31,-365.75 cw(c476.31,-350) 476.31,-334.25 ; 476.31,-315.75 cw(c476.31,-300) 476.31,-284.25 ; 476.31,-265.75 cw(c476.31,-250) 476.31,-234.25 ; 476.31,-215.75 cw(c476.31,-200) 476.31,-184.25 ; 476.31,-165.75 cw(c476.31,-150) 476.31,-134.25 ; 476.31,-115.75 cw(c476.31,-100) 476.31,-84.25 ; 476.31,-65.75 cw(c476.31,-50) 476.31,-34.25 ; 476.31,-15.75 cw(c476.31,0) 476.31,15.75 ; 476.31,34.25 cw(c476.31,50) 476.31,65.75 ; 476.31,84.25 cw(c476.31,100) 476.31,115.75 ; 476.31,134.25 cw(c476.31,150) 476.31,165.75 ; 476.31,184.25 cw(c476.31,200) 476.31,215.75 ; 476.31,234.25 cw(c476.31,250) 476.31,265.75 ; 476.31,284.25 cw(c476.31,300) 476.31,315.75 ; 476.31,334.25 cw(c476.31,350) 476.31,365.75 ; 476.31,384.25 cw(c476.31,400) 476.31,415.75 ; 476.38,-384.25 476.38,-365.75 ; 476.38,-334.25 476.38,-315.75 ; 476.38,-284.25 476.38,-265.75 ; 476.38,-234.25 476.38,-215.75 ; 476.38,-184.25 476.38,-165.75 ; 476.38,-134.25 476.38,-115.75 ; 476.38,-84.25 476.38,-65.75 ; 476.38,-34.25 476.38,-15.75 ; 476.38,15.75 476.38,34.25 ; 476.38,65.75 476.38,84.25 ; 476.38,115.75 476.38,134.25 ; 476.38,165.75 476.38,184.25 ; 476.38,215.75 476.38,234.25 ; 476.38,265.75 476.38,284.25 ; 476.38,315.75 476.38,334.25 ; 476.38,365.75 476.38,384.25
Mechanical 27:
  lines w7.87: -527.68,-527.68 527.68,-527.68 527.68,527.68 -527.68,527.68 -527.68,-527.68

## LCC-84 [mil]
pads (84):
  rect 31.5x133.86 smd: 1(0,551.18)
  rect 31.5x86.61 smd: 2(-50,574.8) 3(-100,574.8) 4(-150,574.8) 5(-200,574.8) 6(-250,574.8) 7(-300,574.8) 8(-350,574.8) 9(-400,574.8) 10(-450,574.8) 11(-500,574.8) 33(-500,-574.8) 34(-450,-574.8) 35(-400,-574.8) 36(-350,-574.8) 37(-300,-574.8) 38(-250,-574.8) 39(-200,-574.8) 40(-150,-574.8) 41(-100,-574.8) 42(-50,-574.8) 43(0,-574.8) 44(50,-574.8) 45(100,-574.8) 46(150,-574.8) 47(200,-574.8) 48(250,-574.8) 49(300,-574.8) 50(350,-574.8) 51(400,-574.8) 52(450,-574.8) 53(500,-574.8) 75(500,574.8) 76(450,574.8) 77(400,574.8) 78(350,574.8) 79(300,574.8) 80(250,574.8) 81(200,574.8) 82(150,574.8) 83(100,574.8) 84(50,574.8)
  rect 86.61x31.5 smd: 12(-574.8,500) 13(-574.8,450) 14(-574.8,400) 15(-574.8,350) 16(-574.8,300) 17(-574.8,250) 18(-574.8,200) 19(-574.8,150) 20(-574.8,100) 21(-574.8,50) 22(-574.8,0) 23(-574.8,-50) 24(-574.8,-100) 25(-574.8,-150) 26(-574.8,-200) 27(-574.8,-250) 28(-574.8,-300) 29(-574.8,-350) 30(-574.8,-400) 31(-574.8,-450) 32(-574.8,-500) 54(574.8,-500) 55(574.8,-450) 56(574.8,-400) 57(574.8,-350) 58(574.8,-300) 59(574.8,-250) 60(574.8,-200) 61(574.8,-150) 62(574.8,-100) 63(574.8,-50) 64(574.8,0) 65(574.8,50) 66(574.8,100) 67(574.8,150) 68(574.8,200) 69(574.8,250) 70(574.8,300) 71(574.8,350) 72(574.8,400) 73(574.8,450) 74(574.8,500)
Top Overlay:
  lines w8: -576.38,529.92 -529.92,576.38
  text "1" at -25,418.11 h77.5
Mechanical 16:
  drawing of 172 lines, arcs and shapes, not listed
Mechanical 27:
  lines w7.87: -626.1,-626.1 626.1,-626.1 626.1,626.1 -626.1,626.1 -626.1,-626.1

## LCC-100 [mil]
pads (100):
  rect 31.5x133.86 smd: 1(0,649.61)
  rect 31.5x86.61 smd: 2(-50,673.23) 3(-100,673.23) 4(-150,673.23) 5(-200,673.23) 6(-250,673.23) 7(-300,673.23) 8(-350,673.23) 9(-400,673.23) 10(-450,673.23) 11(-500,673.23) 12(-550,673.23) 13(-600,673.23) 39(-600,-673.23) 40(-550,-673.23) 41(-500,-673.23) 42(-450,-673.23) 43(-400,-673.23) 44(-350,-673.23) 45(-300,-673.23) 46(-250,-673.23) 47(-200,-673.23) 48(-150,-673.23) 49(-100,-673.23) 50(-50,-673.23) 51(0,-673.23) 52(50,-673.23) 53(100,-673.23) 54(150,-673.23) 55(200,-673.23) 56(250,-673.23) 57(300,-673.23) 58(350,-673.23) 59(400,-673.23) 60(450,-673.23) 61(500,-673.23) 62(550,-673.23) 63(600,-673.23) 89(600,673.23) 90(550,673.23) 91(500,673.23) 92(450,673.23) 93(400,673.23) 94(350,673.23) 95(300,673.23) 96(250,673.23) 97(200,673.23) 98(150,673.23) 99(100,673.23) 100(50,673.23)
  rect 86.61x31.5 smd: 14(-673.23,600) 15(-673.23,550) 16(-673.23,500) 17(-673.23,450) 18(-673.23,400) 19(-673.23,350) 20(-673.23,300) 21(-673.23,250) 22(-673.23,200) 23(-673.23,150) 24(-673.23,100) 25(-673.23,50) 26(-673.23,0) 27(-673.23,-50) 28(-673.23,-100) 29(-673.23,-150) 30(-673.23,-200) 31(-673.23,-250) 32(-673.23,-300) 33(-673.23,-350) 34(-673.23,-400) 35(-673.23,-450) 36(-673.23,-500) 37(-673.23,-550) 38(-673.23,-600) 64(673.23,-600) 65(673.23,-550) 66(673.23,-500) 67(673.23,-450) 68(673.23,-400) 69(673.23,-350) 70(673.23,-300) 71(673.23,-250) 72(673.23,-200) 73(673.23,-150) 74(673.23,-100) 75(673.23,-50) 76(673.23,0) 77(673.23,50) 78(673.23,100) 79(673.23,150) 80(673.23,200) 81(673.23,250) 82(673.23,300) 83(673.23,350) 84(673.23,400) 85(673.23,450) 86(673.23,500) 87(673.23,550) 88(673.23,600)
Top Overlay:
  lines w8: -676.38,629.92 -629.92,676.38
  text "1" at -25,518.11 h77.5
Mechanical 16:
  drawing of 204 lines, arcs and shapes, not listed
Mechanical 27:
  lines w7.87: -724.53,-724.53 724.53,-724.53 724.53,724.53 -724.53,724.53 -724.53,-724.53